# Altium footprint library ACTION_Connector.PcbLib: 138 footprints (part 1 of 9)
Each footprint in its own frame and in the unit in brackets; x right, y up, seen from the top. Pads: shape width x height; smd on the part's side, far side on the other; paste and mask are expansions set on the pad; w line width, h text height; cw(c..) or ccw(c..) is an arc to the next point about the centre after c.
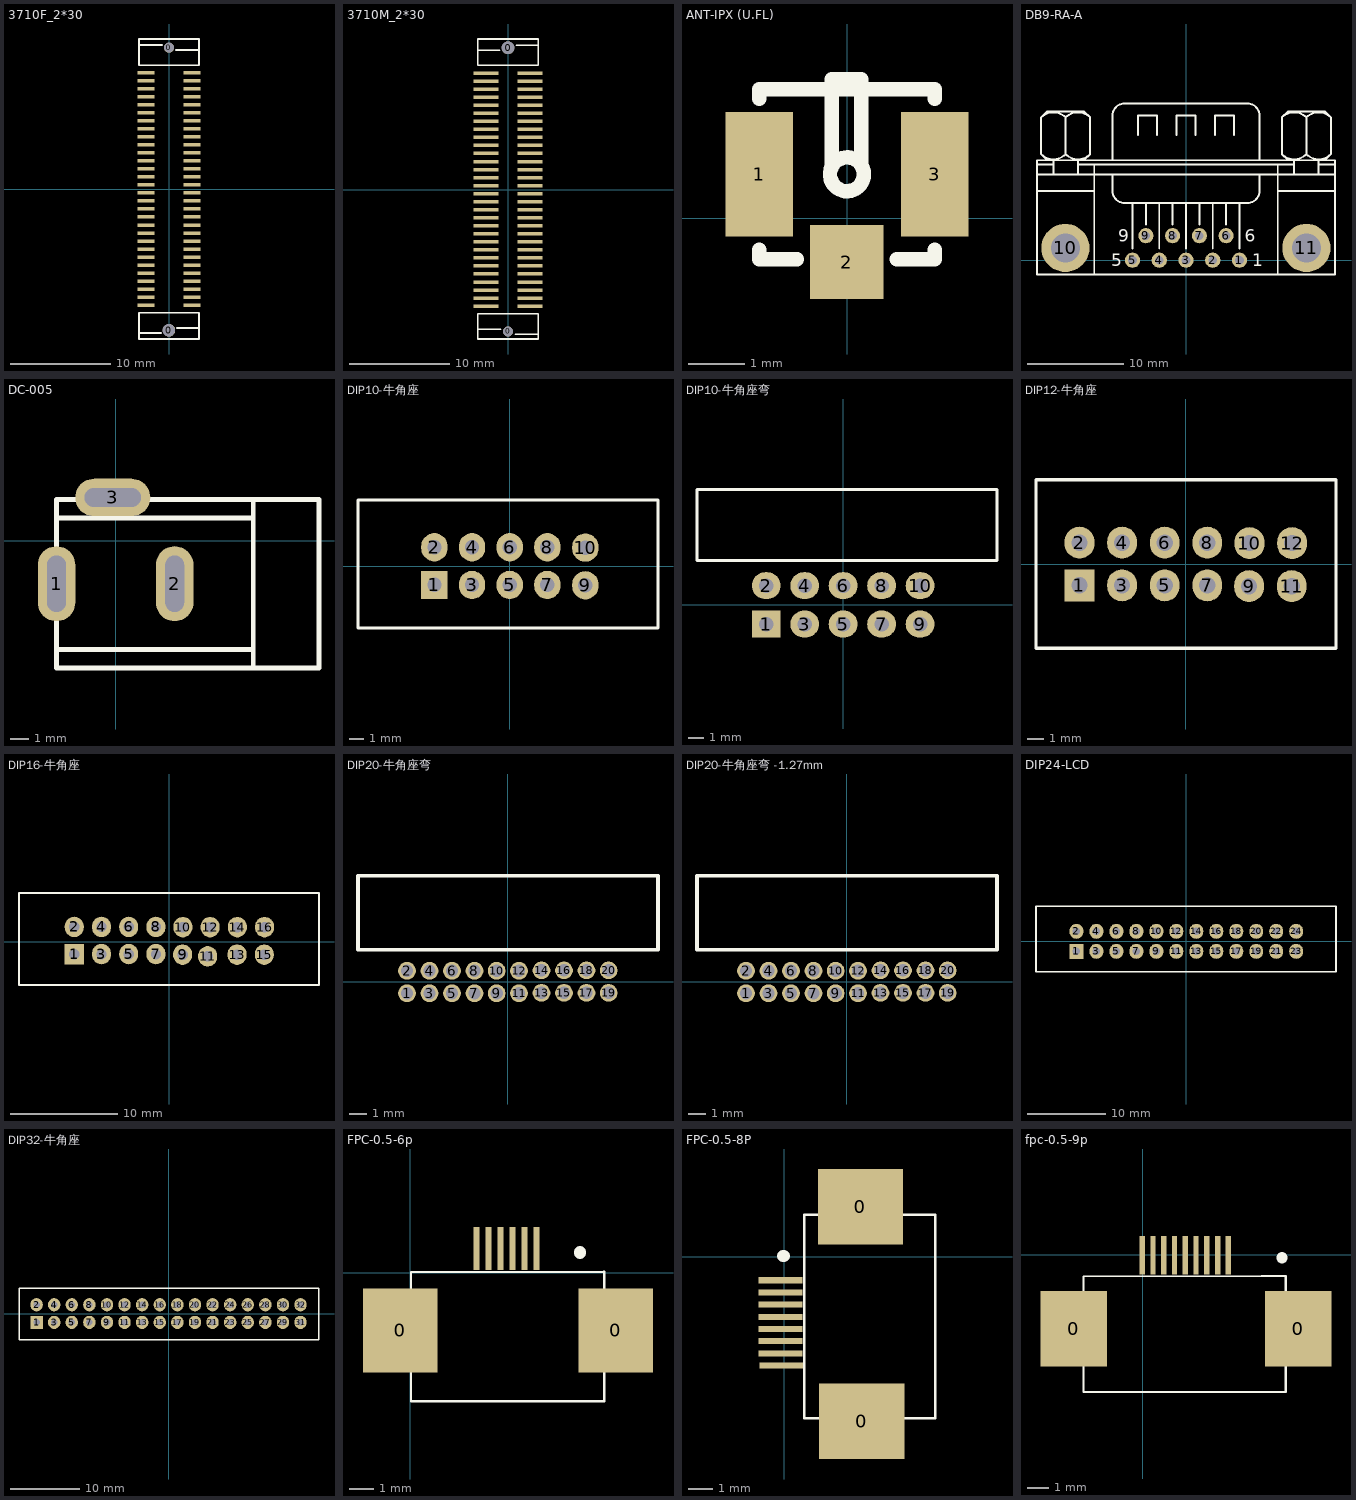
[diagram p0: the footprints below, top view; thin cyan lines are the x and y axes]

## 3710F_2*30 [mm] "PIN:0.8mm;SOP;FEMALE"
height 4.6
pads (62):
  round 1.25 hole 1.25: 0(0,-14.125)
  round 1 hole 1: 0(0,14.125)
  rect 1.7x0.35 smd: 1(-2.3,11.6) 2(-2.3,10.8) 3(-2.3,10) 4(-2.3,9.2) 5(-2.3,8.4) 6(-2.3,7.6) 7(-2.3,6.8) 8(-2.3,6) 9(-2.3,5.2) 10(-2.3,4.4) 11(-2.3,3.6) 12(-2.3,2.8) 13(-2.3,2) 14(-2.3,1.2) 15(-2.3,0.4) 16(-2.3,-0.4) 17(-2.3,-1.2) 18(-2.3,-2) 19(-2.3,-2.8) 20(-2.3,-3.6) 21(-2.3,-4.4) 22(-2.3,-5.2) 23(-2.3,-6) 24(-2.3,-6.8) 25(-2.3,-7.6) 26(-2.3,-8.4) 27(-2.3,-9.2) 28(-2.3,-10) 29(-2.3,-10.8) 30(-2.3,-11.6) 31(2.3,-11.6) 32(2.3,-10.8) 33(2.3,-10) 34(2.3,-9.2) 35(2.3,-8.4) 36(2.3,-7.6) 37(2.3,-6.8) 38(2.3,-6) 39(2.3,-5.2) 40(2.3,-4.4) 41(2.3,-3.6) 42(2.3,-2.8) 43(2.3,-2) 44(2.3,-1.2) 45(2.3,-0.4) 46(2.3,0.4) 47(2.3,1.2) 48(2.3,2) 49(2.3,2.8) 50(2.3,3.6) 51(2.3,4.4) 52(2.3,5.2) 53(2.3,6) 54(2.3,6.8) 55(2.3,7.6) 56(2.3,8.4) 57(2.3,9.2) 58(2.3,10) 59(2.3,10.8) 60(2.3,11.6)
Top Overlay:
  lines w0.152: -3,-14.4 -0.8,-14.4 ; -3,14.4 -0.7,14.4 ; 0.7,13.9 3,13.9 ; 0.8,-13.9 3,-13.9 ; 2.975,12.375 -3,12.375 -3,15 3,15 3,12.375 ; -3,-15 3,-15 3,-12.375 -3,-12.375 -3,-15

## 3710M_2*30 [mm] "PIN:0.8mm;SOP;MALE"
height 4.6
pads (62):
  round 1.25 hole 1.25: 0(0,14.125)
  round 1 hole 1: 0(0,-14.125)
  rect 2.5x0.35 smd: 1(2.2,11.6) 2(2.2,10.8) 3(2.2,10) 4(2.2,9.2) 5(2.2,8.4) 6(2.2,7.6) 7(2.2,6.8) 8(2.2,6) 9(2.2,5.2) 10(2.2,4.4) 11(2.2,3.6) 12(2.2,2.8) 13(2.2,2) 14(2.2,1.2) 15(2.2,0.4) 16(2.2,-0.4) 17(2.2,-1.2) 18(2.2,-2) 19(2.2,-2.8) 20(2.2,-3.6) 21(2.2,-4.4) 22(2.2,-5.2) 23(2.2,-6) 24(2.2,-6.8) 25(2.2,-7.6) 26(2.2,-8.4) 27(2.2,-9.2) 28(2.2,-10) 29(2.2,-10.8) 30(2.2,-11.6) 31(-2.2,-11.6) 32(-2.2,-10.8) 33(-2.2,-10) 34(-2.2,-9.2) 35(-2.2,-8.4) 36(-2.2,-7.6) 37(-2.2,-6.8) 38(-2.2,-6) 39(-2.2,-5.2) 40(-2.2,-4.4) 41(-2.2,-3.6) 42(-2.2,-2.8) 43(-2.2,-2) 44(-2.2,-1.2) 45(-2.2,-0.4) 46(-2.2,0.4) 47(-2.2,1.2) 48(-2.2,2) 49(-2.2,2.8) 50(-2.2,3.6) 51(-2.2,4.4) 52(-2.2,5.2) 53(-2.2,6) 54(-2.2,6.8) 55(-2.2,7.6) 56(-2.2,8.4) 57(-2.2,9.2) 58(-2.2,10) 59(-2.2,10.8) 60(-2.2,11.6)
Top Overlay:
  lines w0.152: -3,-13.9 -0.7,-13.9 ; -3,-12.375 -3,-14.875 3,-14.875 3,-12.375 -2.975,-12.375 ; -3,13.9 -0.8,13.9 ; 0.7,-14.4 3,-14.4 ; 0.8,14.4 3,14.4 ; -3,12.375 -3,15 3,15 3,12.375 -3,12.375

## ANT-IPX (U.FL) [mm]
pads (3):
  rect 1.2x2.2 smd: 1(-1.55,0.775) 3(1.55,0.775)
  rect 1.3x1.3 smd: 2(-0.001,-0.775)
Top Overlay:
  circle w0.254: c-0.001,0.775 r0.3
  lines w0.254: -1.551,-0.556 -1.551,-0.725 -0.882,-0.725 ; -1.551,2.106 -1.551,2.275 1.549,2.275 1.549,2.106 ; -0.271,0.915 -0.271,2.455 0.249,2.455 0.249,0.955 ; 0.88,-0.725 1.549,-0.725 1.549,-0.556
3D body "User Library-1909763-1.step": height 1.3, standoff 0.02, extent -1.475,-0.864 1.525,1.986

## DB9-RA-A [mil]
pads (11):
  round 62 hole 35: 1(218.33,0) 2(109.17,0) 3(0,0) 4(-109.17,0) 5(-218.33,0) 6(163.75,100) 7(54.58,100) 8(-54.58,100) 9(-163.75,100)
  round 196.67 hole 118.33: 10(-492.5,50) 11(491.67,50)
Top Overlay:
  lines w7.87: -608.79,283.07 -374.54,283.07 ; -608.79,349.74 608.79,349.74 ; -608.79,391.4 -541.67,391.4 ; -591.75,432.99 ccw(c-541.67,483.07) -491.58,432.99 ; -591.75,583.16 cw(c-541.67,533.07) -491.58,583.16 ; -566.67,408.07 -591.67,433.07 -591.67,583.07 -566.67,608.07 -416.67,608.07 -391.67,583.07 -391.67,433.07 -416.67,408.07 ; -541.67,349.74 -541.67,408.07 ; -491.75,432.99 ccw(c-441.67,483.07) -391.58,432.99 ; -491.75,583.16 cw(c-441.67,533.07) -391.58,583.16 ; -491.67,433.07 -491.67,583.07 ; -441.67,349.74 -441.67,408.07 ; -441.67,391.4 440.83,391.4 ; -374.54,-59.06 -374.54,391.4 ; -300,349.74 -300,283.07 ccw(c-250,283.07) -250,233.07 ; -300,408.07 -300,590.55 cw(c-250,590.55) -250,640.55 250,640.55 cw(c250,590.55) 300,590.55 300,408.07 ; -218.33,47.24 -218.33,233.07 ; -196.85,511.81 -196.85,590.55 -118.11,590.55 -118.11,511.81 ; -163.75,145.67 -163.75,233.07 ; -109.17,47.24 -109.17,233.07 ; -54.58,145.67 -54.58,233.07 ; -39.37,511.81 -39.37,590.55 0,590.55 39.37,590.55 39.37,511.81 ; 0,47.24 0,233.07 -250,233.07 ; 54.58,145.67 54.58,233.07 ; 109.17,47.24 109.17,233.07 ; 118.11,511.81 118.11,590.55 196.85,590.55 196.85,511.81 ; 163.75,145.67 163.75,233.07 ; 218.33,47.24 218.33,233.07 ; 300,349.74 300,283.07 cw(c250,283.07) 250,233.07 -250,233.07 ; 374.54,-59.06 374.54,391.4 ; 374.54,283.07 608.79,283.07 ; 391.58,432.99 ccw(c441.67,483.07) 491.75,432.99 ; 391.58,583.16 cw(c441.67,533.07) 491.75,583.16 ; 416.67,408.07 391.67,433.07 391.67,583.07 416.67,608.07 566.67,608.07 591.67,583.07 591.67,433.07 566.67,408.07 ; 440.83,349.74 440.83,408.07 ; 491.58,432.99 ccw(c541.66,483.07) 591.75,432.99 ; 491.58,583.16 cw(c541.66,533.07) 591.75,583.16 ; 491.67,433.07 491.67,583.07 ; 540.83,349.74 540.83,408.07 ; 540.83,391.4 608.79,391.4 ; -608.79,-59.06 -366.67,-59.06 366.67,-59.06 608.79,-59.06 608.79,408.07 -608.79,408.07 -608.79,-59.06
  text "6" at 239.68,74.8 h50
  text "1" at 271.18,-25.59 h50
  text "5" at -304.46,-25.59 h50
  text "9" at -275.75,74.8 h50
3D body "User Library-DRB-9M.STEP": height 501.97, standoff -143.7, extent -599.29,-58.8 601.5,638.05

## DC-005 [mm]
pads (3):
  oval 2x4 hole 1 slot 3 at 90 deg: 1(-3.15,-2.3) 2(3.15,-2.3)
  oval 4x2 hole 1 slot 3 at 0 deg: 3(-0.15,2.3)
Top Overlay:
  lines w0.254: -3.15,-5.805 7.34,-5.805 ; -3.15,1.205 7.34,1.205 ; 7.34,-6.796 7.34,2.196 ; -3.15,-6.796 10.845,-6.796 10.845,2.196 -3.15,2.196 -3.15,-6.796
3D body "User Library-dc range - dc connector[4840_2201].STEP": height 11.02, standoff -3.48, extent -3.193,-6.803 10.633,2.703

## DIP10-牛角座 [mil]
pads (10):
  rect 70x75 hole 38: 1(-200.5,-49.5)
  oval 70x75 hole 38: 2(-200.5,50.5) 3(-100.5,-49.5) 4(-100.5,50.5) 5(-0.5,-49.5) 6(-0.5,50.5) 7(99.5,-49.5) 8(99.5,50.5) 9(200.5,-50.5) 10(200.5,49.5)
Top Overlay:
  lines w7.87: -403.5,-163.5 393.5,-163.5 393.5,175.5 -403.5,175.5 -403.5,-163.5
3D body "BH-10.STEP": height 348.1, standoff -129.92, extent -406.29,-171.7 395.29,190.5

## DIP10-牛角座弯 [mil] "Connector; Header; 7x2 Position"
height 23.62
pads (10):
  rect 75x70 hole 38: 1(-200,-50)
  oval 75x70 hole 38: 2(-200,50) 3(-100,-50) 4(-100,50) 5(0,-50) 6(0,50) 7(100,-50) 8(100,50) 9(200,-50) 10(200,50)
Top Overlay:
  lines w7.87: -380,115 -380,300 400,300 400,115 -380,115

## DIP12-牛角座 [mil]
pads (12):
  rect 70x75 hole 38: 1(-249.5,-49)
  oval 70x75 hole 38: 2(-249.5,51) 3(-149.5,-49) 4(-149.5,51) 5(-49.5,-49) 6(-49.5,51) 7(50.5,-49) 8(50.5,51) 9(148.5,-51) 10(149.5,50) 11(248.5,-51) 12(249.5,50)
Top Overlay:
  lines w7.87: -351.5,-197 352.5,-197 352.5,199 -351.5,199 -351.5,-197
3D body "牛角座-12P-2.54直针.stp": height 128.74, standoff -414.57, extent -346.56,-187.92 345.57,195.94

## DIP16-牛角座 [mil]
pads (16):
  rect 70x75 hole 38: 1(-349.5,-46)
  oval 70x75 hole 38: 2(-349.5,54) 3(-249.5,-46) 4(-249.5,54) 5(-149.5,-46) 6(-149.5,54) 7(-49.5,-46) 8(-49.5,54) 9(48.5,-48) 10(49.5,53) 11(140.5,-54) 12(149.5,53) 13(248.5,-48) 14(249.5,53) 15(348.5,-48) 16(349.5,53)
Top Overlay:
  lines w7.87: -552.5,-160 549.5,-160 549.5,179 -552.5,179 -552.5,-160
3D body "BH-16.STEP": height 348.1, standoff -129.92, extent -548.29,-170.2 553.29,192

## DIP20-牛角座弯 [mm]
pads (20):
  round 1 hole 0.7: 1(-5.692,-0.648) 2(-5.692,0.622) 3(-4.422,-0.648) 4(-4.422,0.622) 5(-3.152,-0.648) 6(-3.152,0.622) 7(-1.882,-0.648) 8(-1.882,0.622) 9(-0.632,-0.648) 10(-0.632,0.622) 11(0.632,-0.648) 12(0.632,0.622) 13(1.902,-0.622) 14(1.902,0.648) 15(3.172,-0.622) 16(3.172,0.648) 17(4.442,-0.622) 18(4.442,0.648) 19(5.692,-0.622) 20(5.692,0.648)
Top Overlay:
  lines w0.198: -8.461,1.816 -8.461,5.982 8.481,5.982 8.481,1.816 -8.436,1.816

## DIP20-牛角座弯 -1.27mm [mm]
pads (20):
  round 1 hole 0.7: 1(-5.692,-0.648) 2(-5.692,0.622) 3(-4.422,-0.648) 4(-4.422,0.622) 5(-3.152,-0.648) 6(-3.152,0.622) 7(-1.882,-0.648) 8(-1.882,0.622) 9(-0.632,-0.648) 10(-0.632,0.622) 11(0.632,-0.648) 12(0.632,0.622) 13(1.902,-0.622) 14(1.902,0.648) 15(3.172,-0.622) 16(3.172,0.648) 17(4.442,-0.622) 18(4.442,0.648) 19(5.692,-0.622) 20(5.692,0.648)
Top Overlay:
  lines w0.198: -8.461,1.816 -8.461,5.982 8.481,5.982 8.481,1.816 -8.436,1.816

## DIP24-LCD [mil]
pads (24):
  rect 70x75 hole 38: 1(-550,-50)
  oval 70x75 hole 38: 2(-550,50) 3(-450,-50) 4(-450,50) 5(-350,-50) 6(-350,50) 7(-250,-50) 8(-250,50) 9(-150,-50) 10(-150,50) 11(-50,-50) 12(-50,50) 13(50,-50) 14(50,50) 15(150,-50) 16(150,50) 17(250,-50) 18(250,50) 19(350,-50) 20(350,50) 21(450,-50) 22(450,50) 23(550,-50) 24(550,50)
Top Overlay:
  lines w7.87: -752,-153 -752,176 749,176 749,-153 -752,-153

## DIP32-牛角座 [mil]
pads (32):
  rect 70x75 hole 38: 1(-750,-50)
  oval 70x75 hole 38: 2(-750,50) 3(-650,-50) 4(-650,50) 5(-550,-50) 6(-550,50) 7(-450,-50) 8(-450,50) 9(-350,-50) 10(-350,50) 11(-250,-50) 12(-250,50) 13(-150,-50) 14(-150,50) 15(-50,-50) 16(-50,50) 17(50,-50) 18(50,50) 19(150,-50) 20(150,50) 21(250,-50) 22(250,50) 23(350,-50) 24(350,50) 25(450,-50) 26(450,50) 27(550,-50) 28(550,50) 29(650,-50) 30(650,50) 31(750,-50) 32(750,50)
Top Overlay:
  lines w7.87: -850,-150 -850,145 855,145 855,-150 -850,-150

## FPC-0.5-6p [mm]
pads (8):
  rect 3.1x3.5 smd: 0(-0.432,-2.388) 0(8.56,-2.388)
  rect 0.25x1.8 smd: 1(2.755,1.016) 2(3.255,1.016) 3(3.755,1.016) 4(4.255,1.016) 5(4.755,1.016) 6(5.255,1.016)
Top Overlay:
  lines w0.1: 8.052,0.05 0.025,0.026 0.025,-5.334 8.077,-5.334 8.077,0.051
  lines w0.5: 7.061,0.838 7.061,0.864
3D body "FPC-6pin .stp": height 2.02, standoff -0.03, extent -0.2,-4.943 8.23,0.167

## FPC-0.5-8P [mm]
pads (10):
  rect 3.5x3.1 smd: 0(3.124,2.056) 0(3.175,-6.758)
  rect 1.8x0.25 smd: 1(-0.152,-0.967) 2(-0.152,-1.467) 3(-0.152,-1.967) 4(-0.152,-2.467) 5(-0.152,-2.967) 6(-0.152,-3.467) 7(-0.152,-3.967) 8(-0.127,-4.472)
Top Overlay:
  lines w0.1: 0.813,-6.631 0.813,-0.764 ; 0.813,-0.916 0.813,1.726 6.198,1.726 6.198,-6.631
  lines w0.101: 0.813,-6.631 6.198,-6.631
  lines w0.5: -0.051,0.024 -0.025,0.024
3D body "FPC-8-0.5MM.stp": height 2.02, standoff -0.03, extent 0.615,-7.407 5.725,2.023

## fpc-0.5-9p [mm]
pads (11):
  rect 3.1x3.5 smd: 0(-3.2,-3.429) 0(7.239,-3.429)
  rect 0.25x1.8 smd: 1(-0.014,-0.025) 2(0.486,-0.025) 3(0.986,-0.025) 4(1.486,-0.025) 5(1.986,-0.025) 6(2.486,-0.025) 7(2.986,-0.025) 8(3.486,-0.025) 9(3.986,-0.025)
Top Overlay:
  lines w0.1: 5.537,-0.991 6.629,-0.991 ; 5.69,-0.991 -2.743,-1.015 -2.743,-6.375 6.629,-6.375 ; 6.655,-6.375 6.655,-0.991
  lines w0.5: 6.477,-0.152 6.477,-0.127
3D body "FPC-9-0.5MM.stp": height 2.02, standoff -0.03, extent -2.984,-5.897 6.946,-0.787